# Altium schematic symbol library jlcpcb_2025_04_inductors_extended_0402.schlib: 1396 symbols (part 6 of 8) (continued)
## SDCL1005C1N2STDFM01
designator L?  Inductance: 1.2nH
Inductor, 1.2nH, SMD 0402; Manufacturer: Sunlord; Manufacturer Part Number: SDCL1005C1N2STDFM01; Package Size: 0402; JLCPCB Basic Part: No; JLCPCB Part Number: C279955; Supplier 1: LCSC; Category: Inductors; Supplier Part Number 1: C279955; RoHS: Yes; ComponentLink1Description: Datasheet; ComponentLink1URL: https://wmsc.lcsc.com/wmsc/upload/file/pdf/v2/lcsc/2110081430_Sunlord-SDCL1005C1N2STDFM01_C279955.pdf; ComponentLink2Description: JLCPCB Part URL; ComponentLink2URL: https://jlcpcb.com/partdetail/C279955; ComponentLink3Description: LCSC Part URL; ComponentLink3URL: https://lcsc.com/product-detail/Inductors-SMD_Sunlord-Sunlord-SDCL1005C1N2STDFM01_C279955.html
footprint IND-0402 (0402 (1005M) Inductor)
pins: 1, 2

## SDCL1005C1N3STDF
designator L?  Inductance: 1.3nH
Inductor, 1.3nH, 100mΩ, 400mA, SMD 0402; Manufacturer: Sunlord; Manufacturer Part Number: SDCL1005C1N3STDF; Self-Resonant Frequency: 10GHz; Q Factor: 8@100MHz; Package Size: 0402; JLCPCB Basic Part: No; JLCPCB Part Number: C279756; Supplier 1: LCSC; Category: Inductors; Supplier Part Number 1: C279756; Rated Current: 400mA; DC Resistance: 100mΩ; RoHS: Yes; ComponentLink1Description: Datasheet; ComponentLink1URL: https://wmsc.lcsc.com/wmsc/upload/file/pdf/v2/lcsc/2310301641_Sunlord-SDCL1005C1N3STDF_C279756.pdf; ComponentLink2Description: JLCPCB Part URL; ComponentLink2URL: https://jlcpcb.com/partdetail/C279756; ComponentLink3Description: LCSC Part URL; ComponentLink3URL: https://lcsc.com/product-detail/Inductors-SMD_Sunlord-Sunlord-SDCL1005C1N3STDF_C279756.html
footprint IND-0402 (0402 (1005M) Inductor)
pins: 1, 2

## SDCL1005C1N3STDFM01
designator L?  Inductance: 1.3nH
Inductor, 1.3nH, 100mΩ, 400mA, SMD 0402; Manufacturer: Sunlord; Manufacturer Part Number: SDCL1005C1N3STDFM01; Package Size: 0402; JLCPCB Basic Part: No; JLCPCB Part Number: C370195; Supplier 1: LCSC; Category: Inductors; Supplier Part Number 1: C370195; Rated Current: 400mA; DC Resistance: 100mΩ; RoHS: Yes; ComponentLink1Description: Datasheet; ComponentLink1URL: https://wmsc.lcsc.com/wmsc/upload/file/pdf/v2/lcsc/2110081530_Sunlord-SDCL1005C1N3STDFM01_C370195.pdf; ComponentLink2Description: JLCPCB Part URL; ComponentLink2URL: https://jlcpcb.com/partdetail/C370195; ComponentLink3Description: LCSC Part URL; ComponentLink3URL: https://lcsc.com/product-detail/Inductors-SMD_Sunlord-Sunlord-SDCL1005C1N3STDFM01_C370195.html
footprint IND-0402 (0402 (1005M) Inductor)
pins: 1, 2

## SDCL1005C1N5BTDF
designator L?  Inductance: 1.5nH
Inductor, 1.5nH, 100mΩ, 300mA, SMD 0402; Manufacturer: Sunlord; Manufacturer Part Number: SDCL1005C1N5BTDF; Package Size: 0402; JLCPCB Basic Part: No; JLCPCB Part Number: C370196; Supplier 1: LCSC; Category: Inductors; Supplier Part Number 1: C370196; Rated Current: 300mA; DC Resistance: 100mΩ; RoHS: Yes; ComponentLink1Description: Datasheet; ComponentLink1URL: https://wmsc.lcsc.com/wmsc/upload/file/pdf/v2/lcsc/2310301641_Sunlord-SDCL1005C1N5BTDF_C370196.pdf; ComponentLink2Description: JLCPCB Part URL; ComponentLink2URL: https://jlcpcb.com/partdetail/C370196; ComponentLink3Description: LCSC Part URL; ComponentLink3URL: https://lcsc.com/product-detail/Inductors-SMD_Sunlord-Sunlord-SDCL1005C1N5BTDF_C370196.html
footprint IND-0402 (0402 (1005M) Inductor)
pins: 1, 2

## SDCL1005C1N5BTDFM01
designator L?  Inductance: 1.5nH
Inductor, 1.5nH, SMD 0402; Manufacturer: Sunlord; Manufacturer Part Number: SDCL1005C1N5BTDFM01; Package Size: 0402; JLCPCB Basic Part: No; JLCPCB Part Number: C370197; Supplier 1: LCSC; Category: Inductors; Supplier Part Number 1: C370197; RoHS: Yes; ComponentLink1Description: Datasheet; ComponentLink1URL: https://wmsc.lcsc.com/wmsc/upload/file/pdf/v2/lcsc/2110081530_Sunlord-SDCL1005C1N5BTDFM01_C370197.pdf; ComponentLink2Description: JLCPCB Part URL; ComponentLink2URL: https://jlcpcb.com/partdetail/C370197; ComponentLink3Description: LCSC Part URL; ComponentLink3URL: https://lcsc.com/product-detail/Inductors-SMD_Sunlord-Sunlord-SDCL1005C1N5BTDFM01_C370197.html
footprint IND-0402 (0402 (1005M) Inductor)
pins: 1, 2

## SDCL1005C1N5STDF
designator L?  Inductance: 1.5nH
Inductor, 1.5nH, 100mΩ, 300mA, SMD 0402; Manufacturer: Sunlord; Manufacturer Part Number: SDCL1005C1N5STDF; Self-Resonant Frequency: 100MHz; Q Factor: 8@100MHz; Package Size: 0402; JLCPCB Basic Part: No; JLCPCB Part Number: C27146; Supplier 1: LCSC; Category: Inductors; Supplier Part Number 1: C27146; Rated Current: 300mA; DC Resistance: 100mΩ; RoHS: Yes; ComponentLink1Description: Datasheet; ComponentLink1URL: https://wmsc.lcsc.com/wmsc/upload/file/pdf/v2/lcsc/2310301641_Sunlord-SDCL1005C1N5STDF_C27146.pdf; ComponentLink2Description: JLCPCB Part URL; ComponentLink2URL: https://jlcpcb.com/partdetail/C27146; ComponentLink3Description: LCSC Part URL; ComponentLink3URL: https://lcsc.com/product-detail/Inductors-SMD_Sunlord-Sunlord-SDCL1005C1N5STDF_C27146.html
footprint IND-0402 (0402 (1005M) Inductor)
pins: 1, 2

## SDCL1005C1N5STDFM01
designator L?  Inductance: 1.5nH
Inductor, 1.5nH, 100mΩ, 300mA, SMD 0402; Manufacturer: Sunlord; Manufacturer Part Number: SDCL1005C1N5STDFM01; Package Size: 0402; JLCPCB Basic Part: No; JLCPCB Part Number: C370198; Supplier 1: LCSC; Category: Inductors; Supplier Part Number 1: C370198; Rated Current: 300mA; DC Resistance: 100mΩ; RoHS: Yes; ComponentLink1Description: Datasheet; ComponentLink1URL: https://wmsc.lcsc.com/wmsc/upload/file/pdf/v2/lcsc/2110081530_Sunlord-SDCL1005C1N5STDFM01_C370198.pdf; ComponentLink2Description: JLCPCB Part URL; ComponentLink2URL: https://jlcpcb.com/partdetail/C370198; ComponentLink3Description: LCSC Part URL; ComponentLink3URL: https://lcsc.com/product-detail/Inductors-SMD_Sunlord-Sunlord-SDCL1005C1N5STDFM01_C370198.html
footprint IND-0402 (0402 (1005M) Inductor)
pins: 1, 2

## SDCL1005C1N5STDFM02
designator L?  Inductance: 1.5nH
Inductor, 1.5nH, SMD 0402; Manufacturer: Sunlord; Manufacturer Part Number: SDCL1005C1N5STDFM02; Package Size: 0402; JLCPCB Basic Part: No; JLCPCB Part Number: C370199; Supplier 1: LCSC; Category: Inductors; Supplier Part Number 1: C370199; RoHS: Yes; ComponentLink1Description: Datasheet; ComponentLink1URL: https://wmsc.lcsc.com/wmsc/upload/file/pdf/v2/lcsc/2110081530_Sunlord-SDCL1005C1N5STDFM02_C370199.pdf; ComponentLink2Description: JLCPCB Part URL; ComponentLink2URL: https://jlcpcb.com/partdetail/C370199; ComponentLink3Description: LCSC Part URL; ComponentLink3URL: https://lcsc.com/product-detail/Inductors-SMD_Sunlord-Sunlord-SDCL1005C1N5STDFM02_C370199.html
footprint IND-0402 (0402 (1005M) Inductor)
pins: 1, 2

## SDCL1005C1N6STDF
designator L?  Inductance: 1.6nH
Inductor, 1.6nH, 100mΩ, 300mA, SMD 0402; Manufacturer: Sunlord; Manufacturer Part Number: SDCL1005C1N6STDF; Self-Resonant Frequency: 100MHz; Q Factor: 8@100MHz; Package Size: 0402; JLCPCB Basic Part: No; JLCPCB Part Number: C96729; Supplier 1: LCSC; Category: Inductors; Supplier Part Number 1: C96729; Rated Current: 300mA; DC Resistance: 100mΩ; RoHS: Yes; ComponentLink1Description: Datasheet; ComponentLink1URL: https://wmsc.lcsc.com/wmsc/upload/file/pdf/v2/lcsc/2310301641_Sunlord-SDCL1005C1N6STDF_C96729.pdf; ComponentLink2Description: JLCPCB Part URL; ComponentLink2URL: https://jlcpcb.com/partdetail/C96729; ComponentLink3Description: LCSC Part URL; ComponentLink3URL: https://lcsc.com/product-detail/Inductors-SMD_Sunlord-Sunlord-SDCL1005C1N6STDF_C96729.html
footprint IND-0402 (0402 (1005M) Inductor)
pins: 1, 2

## SDCL1005C1N6STDFM01
designator L?  Inductance: 1.6nH
Inductor, 1.6nH, 100mΩ, 300mA, SMD 0402; Manufacturer: Sunlord; Manufacturer Part Number: SDCL1005C1N6STDFM01; Package Size: 0402; JLCPCB Basic Part: No; JLCPCB Part Number: C279912; Supplier 1: LCSC; Category: Inductors; Supplier Part Number 1: C279912; Rated Current: 300mA; DC Resistance: 100mΩ; RoHS: Yes; ComponentLink1Description: Datasheet; ComponentLink1URL: https://wmsc.lcsc.com/wmsc/upload/file/pdf/v2/lcsc/2110081430_Sunlord-SDCL1005C1N6STDFM01_C279912.pdf; ComponentLink2Description: JLCPCB Part URL; ComponentLink2URL: https://jlcpcb.com/partdetail/C279912; ComponentLink3Description: LCSC Part URL; ComponentLink3URL: https://lcsc.com/product-detail/Inductors-SMD_Sunlord-Sunlord-SDCL1005C1N6STDFM01_C279912.html
footprint IND-0402 (0402 (1005M) Inductor)
pins: 1, 2

## SDCL1005C1N8BTDFM01
designator L?  Inductance: 1.8nH
Inductor, 1.8nH, 100mΩ, 300mA, SMD 0402; Manufacturer: Sunlord; Manufacturer Part Number: SDCL1005C1N8BTDFM01; Package Size: 0402; JLCPCB Basic Part: No; JLCPCB Part Number: C279905; Supplier 1: LCSC; Category: Inductors; Supplier Part Number 1: C279905; Rated Current: 300mA; DC Resistance: 100mΩ; RoHS: Yes; ComponentLink1Description: Datasheet; ComponentLink1URL: https://wmsc.lcsc.com/wmsc/upload/file/pdf/v2/lcsc/2110081430_Sunlord-SDCL1005C1N8BTDFM01_C279905.pdf; ComponentLink2Description: JLCPCB Part URL; ComponentLink2URL: https://jlcpcb.com/partdetail/C279905; ComponentLink3Description: LCSC Part URL; ComponentLink3URL: https://lcsc.com/product-detail/Inductors-SMD_Sunlord-Sunlord-SDCL1005C1N8BTDFM01_C279905.html
footprint IND-0402 (0402 (1005M) Inductor)
pins: 1, 2

## SDCL1005C1N8CTDFM01
designator L?  Inductance: 1.8nH
Inductor, 1.8nH, 100mΩ, 300mA, SMD 0402; Manufacturer: Sunlord; Manufacturer Part Number: SDCL1005C1N8CTDFM01; Package Size: 0402; JLCPCB Basic Part: No; JLCPCB Part Number: C279731; Supplier 1: LCSC; Category: Inductors; Supplier Part Number 1: C279731; Rated Current: 300mA; DC Resistance: 100mΩ; RoHS: Yes; ComponentLink1Description: Datasheet; ComponentLink1URL: https://wmsc.lcsc.com/wmsc/upload/file/pdf/v2/lcsc/2110081330_Sunlord-SDCL1005C1N8CTDFM01_C279731.pdf; ComponentLink2Description: JLCPCB Part URL; ComponentLink2URL: https://jlcpcb.com/partdetail/C279731; ComponentLink3Description: LCSC Part URL; ComponentLink3URL: https://lcsc.com/product-detail/Inductors-SMD_Sunlord-Sunlord-SDCL1005C1N8CTDFM01_C279731.html
footprint IND-0402 (0402 (1005M) Inductor)
pins: 1, 2

## SDCL1005C1N8STDF
designator L?  Inductance: 1.8nH
Inductor, 1.8nH, 100mΩ, 300mA, SMD 0402; Manufacturer: Sunlord; Manufacturer Part Number: SDCL1005C1N8STDF; Self-Resonant Frequency: 6GHz; Q Factor: 8@100MHz; Package Size: 0402; JLCPCB Basic Part: No; JLCPCB Part Number: C18304; Supplier 1: LCSC; Category: Inductors; Supplier Part Number 1: C18304; Rated Current: 300mA; DC Resistance: 100mΩ; RoHS: Yes; ComponentLink1Description: Datasheet; ComponentLink1URL: https://wmsc.lcsc.com/wmsc/upload/file/pdf/v2/lcsc/2310301641_Sunlord-SDCL1005C1N8STDF_C18304.pdf; ComponentLink2Description: JLCPCB Part URL; ComponentLink2URL: https://jlcpcb.com/partdetail/C18304; ComponentLink3Description: LCSC Part URL; ComponentLink3URL: https://lcsc.com/product-detail/Inductors-SMD_Sunlord-Sunlord-SDCL1005C1N8STDF_C18304.html
footprint IND-0402 (0402 (1005M) Inductor)
pins: 1, 2

## SDCL1005C1N8STDFM01
designator L?  Inductance: 1.8nH
Inductor, 1.8nH, 100mΩ, 300mA, SMD 0402; Manufacturer: Sunlord; Manufacturer Part Number: SDCL1005C1N8STDFM01; Package Size: 0402; JLCPCB Basic Part: No; JLCPCB Part Number: C370202; Supplier 1: LCSC; Category: Inductors; Supplier Part Number 1: C370202; Rated Current: 300mA; DC Resistance: 100mΩ; RoHS: Yes; ComponentLink1Description: Datasheet; ComponentLink1URL: https://wmsc.lcsc.com/wmsc/upload/file/pdf/v2/lcsc/2110081530_Sunlord-SDCL1005C1N8STDFM01_C370202.pdf; ComponentLink2Description: JLCPCB Part URL; ComponentLink2URL: https://jlcpcb.com/partdetail/C370202; ComponentLink3Description: LCSC Part URL; ComponentLink3URL: https://lcsc.com/product-detail/Inductors-SMD_Sunlord-Sunlord-SDCL1005C1N8STDFM01_C370202.html
footprint IND-0402 (0402 (1005M) Inductor)
pins: 1, 2

## SDCL1005C1N8STDFM02
designator L?  Inductance: 1.8nH
Inductor, 1.8nH, SMD 0402; Manufacturer: Sunlord; Manufacturer Part Number: SDCL1005C1N8STDFM02; Package Size: 0402; JLCPCB Basic Part: No; JLCPCB Part Number: C370203; Supplier 1: LCSC; Category: Inductors; Supplier Part Number 1: C370203; RoHS: Yes; ComponentLink1Description: Datasheet; ComponentLink1URL: https://wmsc.lcsc.com/wmsc/upload/file/pdf/v2/lcsc/2110081530_Sunlord-SDCL1005C1N8STDFM02_C370203.pdf; ComponentLink2Description: JLCPCB Part URL; ComponentLink2URL: https://jlcpcb.com/partdetail/C370203; ComponentLink3Description: LCSC Part URL; ComponentLink3URL: https://lcsc.com/product-detail/Inductors-SMD_Sunlord-Sunlord-SDCL1005C1N8STDFM02_C370203.html
footprint IND-0402 (0402 (1005M) Inductor)
pins: 1, 2

## SDCL1005C2N0BTDF
designator L?  Inductance: 2nH
Inductor, 2nH, 200mΩ, 300mA, SMD 0402; Manufacturer: Sunlord; Manufacturer Part Number: SDCL1005C2N0BTDF; Package Size: 0402; JLCPCB Basic Part: No; JLCPCB Part Number: C279790; Supplier 1: LCSC; Category: Inductors; Supplier Part Number 1: C279790; Rated Current: 300mA; DC Resistance: 200mΩ; RoHS: Yes; ComponentLink1Description: Datasheet; ComponentLink1URL: https://wmsc.lcsc.com/wmsc/upload/file/pdf/v2/lcsc/2310301641_Sunlord-SDCL1005C2N0BTDF_C279790.pdf; ComponentLink2Description: JLCPCB Part URL; ComponentLink2URL: https://jlcpcb.com/partdetail/C279790; ComponentLink3Description: LCSC Part URL; ComponentLink3URL: https://lcsc.com/product-detail/Inductors-SMD_Sunlord-Sunlord-SDCL1005C2N0BTDF_C279790.html
footprint IND-0402 (0402 (1005M) Inductor)
pins: 1, 2

## SDCL1005C2N0CTDF
designator L?  Inductance: 2nH
Inductor, 2nH, 200mΩ, 300mA, SMD 0402; Manufacturer: Sunlord; Manufacturer Part Number: SDCL1005C2N0CTDF; Q Factor: 8@100MHz; Package Size: 0402; JLCPCB Basic Part: No; JLCPCB Part Number: C370205; Supplier 1: LCSC; Category: Inductors; Supplier Part Number 1: C370205; Rated Current: 300mA; DC Resistance: 200mΩ; RoHS: Yes; ComponentLink1Description: Datasheet; ComponentLink1URL: https://wmsc.lcsc.com/wmsc/upload/file/pdf/v2/lcsc/2310301641_Sunlord-SDCL1005C2N0CTDF_C370205.pdf; ComponentLink2Description: JLCPCB Part URL; ComponentLink2URL: https://jlcpcb.com/partdetail/C370205; ComponentLink3Description: LCSC Part URL; ComponentLink3URL: https://lcsc.com/product-detail/Inductors-SMD_Sunlord-Sunlord-SDCL1005C2N0CTDF_C370205.html
footprint IND-0402 (0402 (1005M) Inductor)
pins: 1, 2

## SDCL1005C2N0STDF
designator L?  Inductance: 2nH
Inductor, 2nH, 200mΩ, 300mA, SMD 0402; Manufacturer: Sunlord; Manufacturer Part Number: SDCL1005C2N0STDF; Self-Resonant Frequency: 100MHz; Q Factor: 8@100MHz; Package Size: 0402; JLCPCB Basic Part: No; JLCPCB Part Number: C43365; Supplier 1: LCSC; Category: Inductors; Supplier Part Number 1: C43365; Rated Current: 300mA; DC Resistance: 200mΩ; RoHS: Yes; ComponentLink1Description: Datasheet; ComponentLink1URL: https://wmsc.lcsc.com/wmsc/upload/file/pdf/v2/lcsc/2310301641_Sunlord-SDCL1005C2N0STDF_C43365.pdf; ComponentLink2Description: JLCPCB Part URL; ComponentLink2URL: https://jlcpcb.com/partdetail/C43365; ComponentLink3Description: LCSC Part URL; ComponentLink3URL: https://lcsc.com/product-detail/Inductors-SMD_Sunlord-Sunlord-SDCL1005C2N0STDF_C43365.html
footprint IND-0402 (0402 (1005M) Inductor)
pins: 1, 2

## SDCL1005C2N0STDFM01
designator L?  Inductance: 2nH
Inductor, 2nH, 200mΩ, 300mA, SMD 0402; Manufacturer: Sunlord; Manufacturer Part Number: SDCL1005C2N0STDFM01; Package Size: 0402; JLCPCB Basic Part: No; JLCPCB Part Number: C370206; Supplier 1: LCSC; Category: Inductors; Supplier Part Number 1: C370206; Rated Current: 300mA; DC Resistance: 200mΩ; RoHS: Yes; ComponentLink1Description: Datasheet; ComponentLink1URL: https://wmsc.lcsc.com/wmsc/upload/file/pdf/v2/lcsc/2110081530_Sunlord-SDCL1005C2N0STDFM01_C370206.pdf; ComponentLink2Description: JLCPCB Part URL; ComponentLink2URL: https://jlcpcb.com/partdetail/C370206; ComponentLink3Description: LCSC Part URL; ComponentLink3URL: https://lcsc.com/product-detail/Inductors-SMD_Sunlord-Sunlord-SDCL1005C2N0STDFM01_C370206.html
footprint IND-0402 (0402 (1005M) Inductor)
pins: 1, 2

## SDCL1005C2N2BTDF
designator L?  Inductance: 2.2nH
Inductor, 2.2nH, 200mΩ, 300mA, SMD 0402; Manufacturer: Sunlord; Manufacturer Part Number: SDCL1005C2N2BTDF; Self-Resonant Frequency: 6GHz; Q Factor: 8@100MHz; Package Size: 0402; JLCPCB Basic Part: No; JLCPCB Part Number: C525658; Supplier 1: LCSC; Category: Inductors; Supplier Part Number 1: C525658; Rated Current: 300mA; DC Resistance: 200mΩ; RoHS: Yes; ComponentLink1Description: Datasheet; ComponentLink1URL: https://wmsc.lcsc.com/wmsc/upload/file/pdf/v2/lcsc/2310301641_Sunlord-SDCL1005C2N2BTDF_C525658.pdf; ComponentLink2Description: JLCPCB Part URL; ComponentLink2URL: https://jlcpcb.com/partdetail/C525658; ComponentLink3Description: LCSC Part URL; ComponentLink3URL: https://lcsc.com/product-detail/Inductors-SMD_Sunlord-Sunlord-SDCL1005C2N2BTDF_C525658.html
footprint IND-0402 (0402 (1005M) Inductor)
pins: 1, 2

## SDCL1005C2N2BTDFM01
designator L?  Inductance: 2.2nH
Inductor, 2.2nH, SMD 0402; Manufacturer: Sunlord; Manufacturer Part Number: SDCL1005C2N2BTDFM01; Package Size: 0402; JLCPCB Basic Part: No; JLCPCB Part Number: C370207; Supplier 1: LCSC; Category: Inductors; Supplier Part Number 1: C370207; RoHS: Yes; ComponentLink1Description: Datasheet; ComponentLink1URL: https://wmsc.lcsc.com/wmsc/upload/file/pdf/v2/lcsc/2110081530_Sunlord-SDCL1005C2N2BTDFM01_C370207.pdf; ComponentLink2Description: JLCPCB Part URL; ComponentLink2URL: https://jlcpcb.com/partdetail/C370207; ComponentLink3Description: LCSC Part URL; ComponentLink3URL: https://lcsc.com/product-detail/Inductors-SMD_Sunlord-Sunlord-SDCL1005C2N2BTDFM01_C370207.html
footprint IND-0402 (0402 (1005M) Inductor)
pins: 1, 2

## SDCL1005C2N2CTDF
designator L?  Inductance: 2.2nH
Inductor, 2.2nH, 200mΩ, 300mA, SMD 0402; Manufacturer: Sunlord; Manufacturer Part Number: SDCL1005C2N2CTDF; Self-Resonant Frequency: 6GHz; Q Factor: 8@100MHz; Package Size: 0402; JLCPCB Basic Part: No; JLCPCB Part Number: C918998; Supplier 1: LCSC; Category: Inductors; Supplier Part Number 1: C918998; Rated Current: 300mA; DC Resistance: 200mΩ; RoHS: Yes; ComponentLink1Description: Datasheet; ComponentLink1URL: https://wmsc.lcsc.com/wmsc/upload/file/pdf/v2/lcsc/2310301641_Sunlord-SDCL1005C2N2CTDF_C918998.pdf; ComponentLink2Description: JLCPCB Part URL; ComponentLink2URL: https://jlcpcb.com/partdetail/C918998; ComponentLink3Description: LCSC Part URL; ComponentLink3URL: https://lcsc.com/product-detail/Inductors-SMD_Sunlord-Sunlord-SDCL1005C2N2CTDF_C918998.html
footprint IND-0402 (0402 (1005M) Inductor)
pins: 1, 2

## SDCL1005C2N2STDF
designator L?  Inductance: 2.2nH
Inductor, 2.2nH, 200mΩ, 300mA, SMD 0402; Manufacturer: Sunlord; Manufacturer Part Number: SDCL1005C2N2STDF; Self-Resonant Frequency: 100MHz; Q Factor: 8@100MHz; Package Size: 0402; JLCPCB Basic Part: No; JLCPCB Part Number: C27122; Supplier 1: LCSC; Category: Inductors; Supplier Part Number 1: C27122; Rated Current: 300mA; DC Resistance: 200mΩ; RoHS: Yes; ComponentLink1Description: Datasheet; ComponentLink1URL: https://wmsc.lcsc.com/wmsc/upload/file/pdf/v2/lcsc/2310301641_Sunlord-SDCL1005C2N2STDF_C27122.pdf; ComponentLink2Description: JLCPCB Part URL; ComponentLink2URL: https://jlcpcb.com/partdetail/C27122; ComponentLink3Description: LCSC Part URL; ComponentLink3URL: https://lcsc.com/product-detail/Inductors-SMD_Sunlord-Sunlord-SDCL1005C2N2STDF_C27122.html
footprint IND-0402 (0402 (1005M) Inductor)
pins: 1, 2

## SDCL1005C2N2STDFM01
designator L?  Inductance: 2.2nH
Inductor, 2.2nH, 200mΩ, 300mA, SMD 0402; Manufacturer: Sunlord; Manufacturer Part Number: SDCL1005C2N2STDFM01; Package Size: 0402; JLCPCB Basic Part: No; JLCPCB Part Number: C279853; Supplier 1: LCSC; Category: Inductors; Supplier Part Number 1: C279853; Rated Current: 300mA; DC Resistance: 200mΩ; RoHS: Yes; ComponentLink1Description: Datasheet; ComponentLink1URL: https://wmsc.lcsc.com/wmsc/upload/file/pdf/v2/lcsc/2110081330_Sunlord-SDCL1005C2N2STDFM01_C279853.pdf; ComponentLink2Description: JLCPCB Part URL; ComponentLink2URL: https://jlcpcb.com/partdetail/C279853; ComponentLink3Description: LCSC Part URL; ComponentLink3URL: https://lcsc.com/product-detail/Inductors-SMD_Sunlord-Sunlord-SDCL1005C2N2STDFM01_C279853.html
footprint IND-0402 (0402 (1005M) Inductor)
pins: 1, 2

## SDCL1005C2N2STDFM02
designator L?  Inductance: 2.2nH
Inductor, 2.2nH, SMD 0402; Manufacturer: Sunlord; Manufacturer Part Number: SDCL1005C2N2STDFM02; Package Size: 0402; JLCPCB Basic Part: No; JLCPCB Part Number: C370208; Supplier 1: LCSC; Category: Inductors; Supplier Part Number 1: C370208; RoHS: Yes; ComponentLink1Description: Datasheet; ComponentLink1URL: https://wmsc.lcsc.com/wmsc/upload/file/pdf/v2/lcsc/2110081530_Sunlord-SDCL1005C2N2STDFM02_C370208.pdf; ComponentLink2Description: JLCPCB Part URL; ComponentLink2URL: https://jlcpcb.com/partdetail/C370208; ComponentLink3Description: LCSC Part URL; ComponentLink3URL: https://lcsc.com/product-detail/Inductors-SMD_Sunlord-Sunlord-SDCL1005C2N2STDFM02_C370208.html
footprint IND-0402 (0402 (1005M) Inductor)
pins: 1, 2

## SDCL1005C2N4BTDF
designator L?  Inductance: 2.4nH
Inductor, 2.4nH, 200mΩ, 300mA, SMD 0402; Manufacturer: Sunlord; Manufacturer Part Number: SDCL1005C2N4BTDF; Package Size: 0402; JLCPCB Basic Part: No; JLCPCB Part Number: C370209; Supplier 1: LCSC; Category: Inductors; Supplier Part Number 1: C370209; Rated Current: 300mA; DC Resistance: 200mΩ; RoHS: Yes; ComponentLink1Description: Datasheet; ComponentLink1URL: https://wmsc.lcsc.com/wmsc/upload/file/pdf/v2/lcsc/2310301641_Sunlord-SDCL1005C2N4BTDF_C370209.pdf; ComponentLink2Description: JLCPCB Part URL; ComponentLink2URL: https://jlcpcb.com/partdetail/C370209; ComponentLink3Description: LCSC Part URL; ComponentLink3URL: https://lcsc.com/product-detail/Inductors-SMD_Sunlord-Sunlord-SDCL1005C2N4BTDF_C370209.html
footprint IND-0402 (0402 (1005M) Inductor)
pins: 1, 2

## SDCL1005C2N4BTDFM01
designator L?  Inductance: 2.4nH
Inductor, 2.4nH, SMD 0402; Manufacturer: Sunlord; Manufacturer Part Number: SDCL1005C2N4BTDFM01; Package Size: 0402; JLCPCB Basic Part: No; JLCPCB Part Number: C370210; Supplier 1: LCSC; Category: Inductors; Supplier Part Number 1: C370210; RoHS: Yes; ComponentLink1Description: Datasheet; ComponentLink1URL: https://wmsc.lcsc.com/wmsc/upload/file/pdf/v2/lcsc/2110081530_Sunlord-SDCL1005C2N4BTDFM01_C370210.pdf; ComponentLink2Description: JLCPCB Part URL; ComponentLink2URL: https://jlcpcb.com/partdetail/C370210; ComponentLink3Description: LCSC Part URL; ComponentLink3URL: https://lcsc.com/product-detail/Inductors-SMD_Sunlord-Sunlord-SDCL1005C2N4BTDFM01_C370210.html
footprint IND-0402 (0402 (1005M) Inductor)
pins: 1, 2

## SDCL1005C2N4STDF
designator L?  Inductance: 2.4nH
Inductor, 2.4nH, 200mΩ, 300mA, SMD 0402; Manufacturer: Sunlord; Manufacturer Part Number: SDCL1005C2N4STDF; Self-Resonant Frequency: 100MHz; Q Factor: 8@100MHz; Package Size: 0402; JLCPCB Basic Part: No; JLCPCB Part Number: C22727; Supplier 1: LCSC; Category: Inductors; Supplier Part Number 1: C22727; Rated Current: 300mA; DC Resistance: 200mΩ; RoHS: Yes; ComponentLink1Description: Datasheet; ComponentLink1URL: https://wmsc.lcsc.com/wmsc/upload/file/pdf/v2/lcsc/2310301641_Sunlord-SDCL1005C2N4STDF_C22727.pdf; ComponentLink2Description: JLCPCB Part URL; ComponentLink2URL: https://jlcpcb.com/partdetail/C22727; ComponentLink3Description: LCSC Part URL; ComponentLink3URL: https://lcsc.com/product-detail/Inductors-SMD_Sunlord-Sunlord-SDCL1005C2N4STDF_C22727.html
footprint IND-0402 (0402 (1005M) Inductor)
pins: 1, 2

## SDCL1005C2N4STDFM01
designator L?  Inductance: 2.4nH
Inductor, 2.4nH, 200mΩ, 300mA, SMD 0402; Manufacturer: Sunlord; Manufacturer Part Number: SDCL1005C2N4STDFM01; Package Size: 0402; JLCPCB Basic Part: No; JLCPCB Part Number: C370211; Supplier 1: LCSC; Category: Inductors; Supplier Part Number 1: C370211; Rated Current: 300mA; DC Resistance: 200mΩ; RoHS: Yes; ComponentLink1Description: Datasheet; ComponentLink1URL: https://wmsc.lcsc.com/wmsc/upload/file/pdf/v2/lcsc/2110081530_Sunlord-SDCL1005C2N4STDFM01_C370211.pdf; ComponentLink2Description: JLCPCB Part URL; ComponentLink2URL: https://jlcpcb.com/partdetail/C370211; ComponentLink3Description: LCSC Part URL; ComponentLink3URL: https://lcsc.com/product-detail/Inductors-SMD_Sunlord-Sunlord-SDCL1005C2N4STDFM01_C370211.html
footprint IND-0402 (0402 (1005M) Inductor)
pins: 1, 2

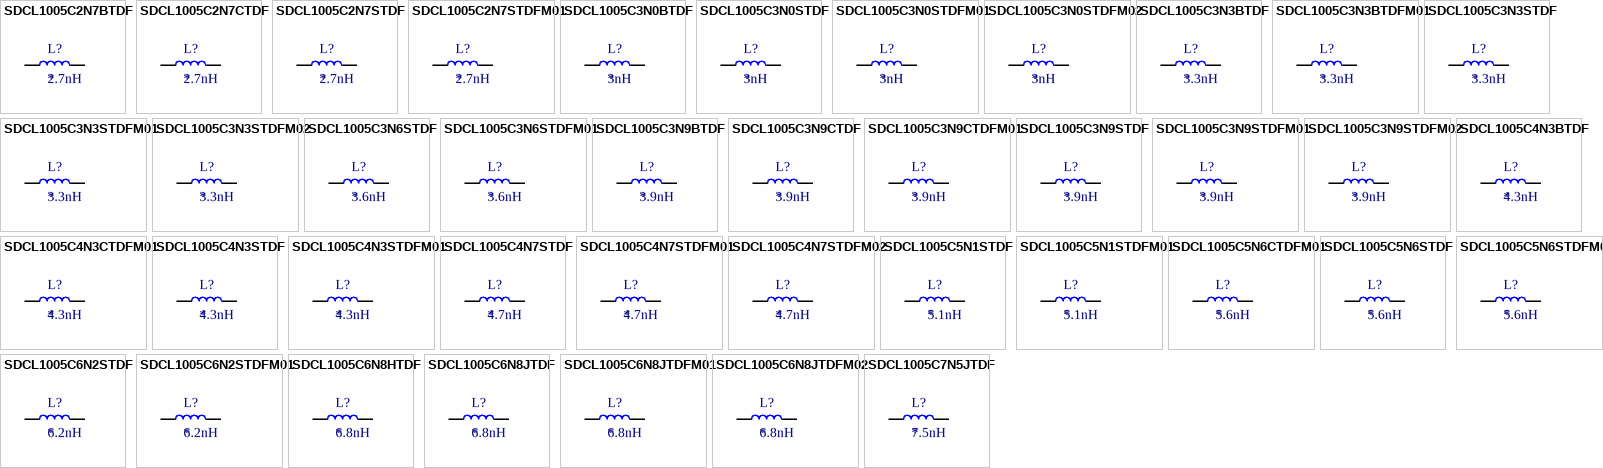
[diagram p27: symbols SDCL1005C2N7BTDF to SDCL1005C7N5JTDF]

## SDCL1005C2N7BTDF
designator L?  Inductance: 2.7nH
Inductor, 2.7nH, 200mΩ, 300mA, SMD 0402; Manufacturer: Sunlord; Manufacturer Part Number: SDCL1005C2N7BTDF; Package Size: 0402; JLCPCB Basic Part: No; JLCPCB Part Number: C279827; Supplier 1: LCSC; Category: Inductors; Supplier Part Number 1: C279827; Rated Current: 300mA; DC Resistance: 200mΩ; RoHS: Yes; ComponentLink1Description: Datasheet; ComponentLink1URL: https://wmsc.lcsc.com/wmsc/upload/file/pdf/v2/lcsc/2310301641_Sunlord-SDCL1005C2N7BTDF_C279827.pdf; ComponentLink2Description: JLCPCB Part URL; ComponentLink2URL: https://jlcpcb.com/partdetail/C279827; ComponentLink3Description: LCSC Part URL; ComponentLink3URL: https://lcsc.com/product-detail/Inductors-SMD_Sunlord-Sunlord-SDCL1005C2N7BTDF_C279827.html
footprint IND-0402 (0402 (1005M) Inductor)
pins: 1, 2

## SDCL1005C2N7CTDF
designator L?  Inductance: 2.7nH
Inductor, 2.7nH, 200mΩ, 300mA, SMD 0402; Manufacturer: Sunlord; Manufacturer Part Number: SDCL1005C2N7CTDF; Self-Resonant Frequency: 100MHz; Q Factor: 8@100MHz; Package Size: 0402; JLCPCB Basic Part: No; JLCPCB Part Number: C370213; Supplier 1: LCSC; Category: Inductors; Supplier Part Number 1: C370213; Rated Current: 300mA; DC Resistance: 200mΩ; RoHS: Yes; ComponentLink1Description: Datasheet; ComponentLink1URL: https://wmsc.lcsc.com/wmsc/upload/file/pdf/v2/lcsc/2310301641_Sunlord-SDCL1005C2N7CTDF_C370213.pdf; ComponentLink2Description: JLCPCB Part URL; ComponentLink2URL: https://jlcpcb.com/partdetail/C370213; ComponentLink3Description: LCSC Part URL; ComponentLink3URL: https://lcsc.com/product-detail/Inductors-SMD_Sunlord-Sunlord-SDCL1005C2N7CTDF_C370213.html
footprint IND-0402 (0402 (1005M) Inductor)
pins: 1, 2

## SDCL1005C2N7STDF
designator L?  Inductance: 2.7nH
Inductor, 2.7nH, 200mΩ, 300mA, SMD 0402; Manufacturer: Sunlord; Manufacturer Part Number: SDCL1005C2N7STDF; Self-Resonant Frequency: 100MHz; Q Factor: 8@100MHz; Package Size: 0402; JLCPCB Basic Part: No; JLCPCB Part Number: C27123; Supplier 1: LCSC; Category: Inductors; Supplier Part Number 1: C27123; Rated Current: 300mA; DC Resistance: 200mΩ; RoHS: Yes; ComponentLink1Description: Datasheet; ComponentLink1URL: https://wmsc.lcsc.com/wmsc/upload/file/pdf/v2/lcsc/2310301641_Sunlord-SDCL1005C2N7STDF_C27123.pdf; ComponentLink2Description: JLCPCB Part URL; ComponentLink2URL: https://jlcpcb.com/partdetail/C27123; ComponentLink3Description: LCSC Part URL; ComponentLink3URL: https://lcsc.com/product-detail/Inductors-SMD_Sunlord-Sunlord-SDCL1005C2N7STDF_C27123.html
footprint IND-0402 (0402 (1005M) Inductor)
pins: 1, 2

## SDCL1005C2N7STDFM01
designator L?  Inductance: 2.7nH
Inductor, 2.7nH, 200mΩ, 300mA, SMD 0402; Manufacturer: Sunlord; Manufacturer Part Number: SDCL1005C2N7STDFM01; Package Size: 0402; JLCPCB Basic Part: No; JLCPCB Part Number: C370214; Supplier 1: LCSC; Category: Inductors; Supplier Part Number 1: C370214; Rated Current: 300mA; DC Resistance: 200mΩ; RoHS: Yes; ComponentLink1Description: Datasheet; ComponentLink1URL: https://wmsc.lcsc.com/wmsc/upload/file/pdf/v2/lcsc/2110081530_Sunlord-SDCL1005C2N7STDFM01_C370214.pdf; ComponentLink2Description: JLCPCB Part URL; ComponentLink2URL: https://jlcpcb.com/partdetail/C370214; ComponentLink3Description: LCSC Part URL; ComponentLink3URL: https://lcsc.com/product-detail/Inductors-SMD_Sunlord-Sunlord-SDCL1005C2N7STDFM01_C370214.html
footprint IND-0402 (0402 (1005M) Inductor)
pins: 1, 2

## SDCL1005C3N0BTDF
designator L?  Inductance: 3nH
Inductor, 3nH, 200mΩ, 300mA, SMD 0402; Manufacturer: Sunlord; Manufacturer Part Number: SDCL1005C3N0BTDF; Package Size: 0402; JLCPCB Basic Part: No; JLCPCB Part Number: C370216; Supplier 1: LCSC; Category: Inductors; Supplier Part Number 1: C370216; Rated Current: 300mA; DC Resistance: 200mΩ; RoHS: Yes; ComponentLink1Description: Datasheet; ComponentLink1URL: https://wmsc.lcsc.com/wmsc/upload/file/pdf/v2/lcsc/2310301641_Sunlord-SDCL1005C3N0BTDF_C370216.pdf; ComponentLink2Description: JLCPCB Part URL; ComponentLink2URL: https://jlcpcb.com/partdetail/C370216; ComponentLink3Description: LCSC Part URL; ComponentLink3URL: https://lcsc.com/product-detail/Inductors-SMD_Sunlord-Sunlord-SDCL1005C3N0BTDF_C370216.html
footprint IND-0402 (0402 (1005M) Inductor)
pins: 1, 2

## SDCL1005C3N0STDF
designator L?  Inductance: 3nH
Inductor, 3nH, 200mΩ, 300mA, SMD 0402; Manufacturer: Sunlord; Manufacturer Part Number: SDCL1005C3N0STDF; Self-Resonant Frequency: 100MHz; Q Factor: 8@100MHz; Package Size: 0402; JLCPCB Basic Part: No; JLCPCB Part Number: C22718; Supplier 1: LCSC; Category: Inductors; Supplier Part Number 1: C22718; Rated Current: 300mA; DC Resistance: 200mΩ; RoHS: Yes; ComponentLink1Description: Datasheet; ComponentLink1URL: https://wmsc.lcsc.com/wmsc/upload/file/pdf/v2/lcsc/2310301641_Sunlord-SDCL1005C3N0STDF_C22718.pdf; ComponentLink2Description: JLCPCB Part URL; ComponentLink2URL: https://jlcpcb.com/partdetail/C22718; ComponentLink3Description: LCSC Part URL; ComponentLink3URL: https://lcsc.com/product-detail/Inductors-SMD_Sunlord-Sunlord-SDCL1005C3N0STDF_C22718.html
footprint IND-0402 (0402 (1005M) Inductor)
pins: 1, 2

## SDCL1005C3N0STDFM01
designator L?  Inductance: 3nH
Inductor, 3nH, 200mΩ, 300mA, SMD 0402; Manufacturer: Sunlord; Manufacturer Part Number: SDCL1005C3N0STDFM01; Package Size: 0402; JLCPCB Basic Part: No; JLCPCB Part Number: C370217; Supplier 1: LCSC; Category: Inductors; Supplier Part Number 1: C370217; Rated Current: 300mA; DC Resistance: 200mΩ; RoHS: Yes; ComponentLink1Description: Datasheet; ComponentLink1URL: https://wmsc.lcsc.com/wmsc/upload/file/pdf/v2/lcsc/2110081530_Sunlord-SDCL1005C3N0STDFM01_C370217.pdf; ComponentLink2Description: JLCPCB Part URL; ComponentLink2URL: https://jlcpcb.com/partdetail/C370217; ComponentLink3Description: LCSC Part URL; ComponentLink3URL: https://lcsc.com/product-detail/Inductors-SMD_Sunlord-Sunlord-SDCL1005C3N0STDFM01_C370217.html
footprint IND-0402 (0402 (1005M) Inductor)
pins: 1, 2

## SDCL1005C3N0STDFM02
designator L?  Inductance: 3nH
Inductor, 3nH, SMD 0402; Manufacturer: Sunlord; Manufacturer Part Number: SDCL1005C3N0STDFM02; Package Size: 0402; JLCPCB Basic Part: No; JLCPCB Part Number: C2680669; Supplier 1: LCSC; Category: Inductors; Supplier Part Number 1: C2680669; RoHS: Yes; ComponentLink1Description: Datasheet; ComponentLink1URL: https://wmsc.lcsc.com/wmsc/upload/file/pdf/v2/lcsc/2110081830_Sunlord-SDCL1005C3N0STDFM02_C2680669.pdf; ComponentLink2Description: JLCPCB Part URL; ComponentLink2URL: https://jlcpcb.com/partdetail/C2680669; ComponentLink3Description: LCSC Part URL; ComponentLink3URL: https://lcsc.com/product-detail/Inductors-SMD_Sunlord-Sunlord-SDCL1005C3N0STDFM02_C2680669.html
footprint IND-0402 (0402 (1005M) Inductor)
pins: 1, 2

## SDCL1005C3N3BTDF
designator L?  Inductance: 3.3nH
Inductor, 3.3nH, 200mΩ, 300mA, SMD 0402; Manufacturer: Sunlord; Manufacturer Part Number: SDCL1005C3N3BTDF; Package Size: 0402; JLCPCB Basic Part: No; JLCPCB Part Number: C370218; Supplier 1: LCSC; Category: Inductors; Supplier Part Number 1: C370218; Rated Current: 300mA; DC Resistance: 200mΩ; RoHS: Yes; ComponentLink1Description: Datasheet; ComponentLink1URL: https://wmsc.lcsc.com/wmsc/upload/file/pdf/v2/lcsc/2310301641_Sunlord-SDCL1005C3N3BTDF_C370218.pdf; ComponentLink2Description: JLCPCB Part URL; ComponentLink2URL: https://jlcpcb.com/partdetail/C370218; ComponentLink3Description: LCSC Part URL; ComponentLink3URL: https://lcsc.com/product-detail/Inductors-SMD_Sunlord-Sunlord-SDCL1005C3N3BTDF_C370218.html
footprint IND-0402 (0402 (1005M) Inductor)
pins: 1, 2

## SDCL1005C3N3BTDFM01
designator L?  Inductance: 3.3nH
Inductor, 3.3nH, SMD 0402; Manufacturer: Sunlord; Manufacturer Part Number: SDCL1005C3N3BTDFM01; Package Size: 0402; JLCPCB Basic Part: No; JLCPCB Part Number: C370219; Supplier 1: LCSC; Category: Inductors; Supplier Part Number 1: C370219; RoHS: Yes; ComponentLink1Description: Datasheet; ComponentLink1URL: https://wmsc.lcsc.com/wmsc/upload/file/pdf/v2/lcsc/2110081530_Sunlord-SDCL1005C3N3BTDFM01_C370219.pdf; ComponentLink2Description: JLCPCB Part URL; ComponentLink2URL: https://jlcpcb.com/partdetail/C370219; ComponentLink3Description: LCSC Part URL; ComponentLink3URL: https://lcsc.com/product-detail/Inductors-SMD_Sunlord-Sunlord-SDCL1005C3N3BTDFM01_C370219.html
footprint IND-0402 (0402 (1005M) Inductor)
pins: 1, 2

## SDCL1005C3N3STDF
designator L?  Inductance: 3.3nH
Inductor, 3.3nH, 200mΩ, 300mA, SMD 0402; Manufacturer: Sunlord; Manufacturer Part Number: SDCL1005C3N3STDF; Q Factor: 8@100MHz; Package Size: 0402; JLCPCB Basic Part: No; JLCPCB Part Number: C16526; Supplier 1: LCSC; Category: Inductors; Supplier Part Number 1: C16526; Rated Current: 300mA; DC Resistance: 200mΩ; RoHS: Yes; ComponentLink1Description: Datasheet; ComponentLink1URL: https://wmsc.lcsc.com/wmsc/upload/file/pdf/v2/lcsc/2310301641_Sunlord-SDCL1005C3N3STDF_C16526.pdf; ComponentLink2Description: JLCPCB Part URL; ComponentLink2URL: https://jlcpcb.com/partdetail/C16526; ComponentLink3Description: LCSC Part URL; ComponentLink3URL: https://lcsc.com/product-detail/Inductors-SMD_Sunlord-Sunlord-SDCL1005C3N3STDF_C16526.html
footprint IND-0402 (0402 (1005M) Inductor)
pins: 1, 2

## SDCL1005C3N3STDFM01
designator L?  Inductance: 3.3nH
Inductor, 3.3nH, 200mΩ, 300mA, SMD 0402; Manufacturer: Sunlord; Manufacturer Part Number: SDCL1005C3N3STDFM01; Package Size: 0402; JLCPCB Basic Part: No; JLCPCB Part Number: C279777; Supplier 1: LCSC; Category: Inductors; Supplier Part Number 1: C279777; Rated Current: 300mA; DC Resistance: 200mΩ; RoHS: Yes; ComponentLink1Description: Datasheet; ComponentLink1URL: https://wmsc.lcsc.com/wmsc/upload/file/pdf/v2/lcsc/2110081330_Sunlord-SDCL1005C3N3STDFM01_C279777.pdf; ComponentLink2Description: JLCPCB Part URL; ComponentLink2URL: https://jlcpcb.com/partdetail/C279777; ComponentLink3Description: LCSC Part URL; ComponentLink3URL: https://lcsc.com/product-detail/Inductors-SMD_Sunlord-Sunlord-SDCL1005C3N3STDFM01_C279777.html
footprint IND-0402 (0402 (1005M) Inductor)
pins: 1, 2

## SDCL1005C3N3STDFM02
designator L?  Inductance: 3.3nH
Inductor, 3.3nH, SMD 0402; Manufacturer: Sunlord; Manufacturer Part Number: SDCL1005C3N3STDFM02; Package Size: 0402; JLCPCB Basic Part: No; JLCPCB Part Number: C370220; Supplier 1: LCSC; Category: Inductors; Supplier Part Number 1: C370220; RoHS: Yes; ComponentLink1Description: Datasheet; ComponentLink1URL: https://wmsc.lcsc.com/wmsc/upload/file/pdf/v2/lcsc/2110081530_Sunlord-SDCL1005C3N3STDFM02_C370220.pdf; ComponentLink2Description: JLCPCB Part URL; ComponentLink2URL: https://jlcpcb.com/partdetail/C370220; ComponentLink3Description: LCSC Part URL; ComponentLink3URL: https://lcsc.com/product-detail/Inductors-SMD_Sunlord-Sunlord-SDCL1005C3N3STDFM02_C370220.html
footprint IND-0402 (0402 (1005M) Inductor)
pins: 1, 2

## SDCL1005C3N6STDF
designator L?  Inductance: 3.6nH
Inductor, 3.6nH, 200mΩ, 300mA, SMD 0402; Manufacturer: Sunlord; Manufacturer Part Number: SDCL1005C3N6STDF; Self-Resonant Frequency: 100MHz; Q Factor: 8@100MHz; Package Size: 0402; JLCPCB Basic Part: No; JLCPCB Part Number: C279530; Supplier 1: LCSC; Category: Inductors; Supplier Part Number 1: C279530; Rated Current: 300mA; DC Resistance: 200mΩ; RoHS: Yes; ComponentLink1Description: Datasheet; ComponentLink1URL: https://wmsc.lcsc.com/wmsc/upload/file/pdf/v2/lcsc/2310301641_Sunlord-SDCL1005C3N6STDF_C279530.pdf; ComponentLink2Description: JLCPCB Part URL; ComponentLink2URL: https://jlcpcb.com/partdetail/C279530; ComponentLink3Description: LCSC Part URL; ComponentLink3URL: https://lcsc.com/product-detail/Inductors-SMD_Sunlord-Sunlord-SDCL1005C3N6STDF_C279530.html
footprint IND-0402 (0402 (1005M) Inductor)
pins: 1, 2

## SDCL1005C3N6STDFM01
designator L?  Inductance: 3.6nH
Inductor, 3.6nH, 200mΩ, 300mA, SMD 0402; Manufacturer: Sunlord; Manufacturer Part Number: SDCL1005C3N6STDFM01; Package Size: 0402; JLCPCB Basic Part: No; JLCPCB Part Number: C370221; Supplier 1: LCSC; Category: Inductors; Supplier Part Number 1: C370221; Rated Current: 300mA; DC Resistance: 200mΩ; RoHS: Yes; ComponentLink1Description: Datasheet; ComponentLink1URL: https://wmsc.lcsc.com/wmsc/upload/file/pdf/v2/lcsc/2110081530_Sunlord-SDCL1005C3N6STDFM01_C370221.pdf; ComponentLink2Description: JLCPCB Part URL; ComponentLink2URL: https://jlcpcb.com/partdetail/C370221; ComponentLink3Description: LCSC Part URL; ComponentLink3URL: https://lcsc.com/product-detail/Inductors-SMD_Sunlord-Sunlord-SDCL1005C3N6STDFM01_C370221.html
footprint IND-0402 (0402 (1005M) Inductor)
pins: 1, 2

## SDCL1005C3N9BTDF
designator L?  Inductance: 3.9nH
Inductor, 3.9nH, 0.2Ω, 300mA, SMD 0402; Manufacturer: Sunlord; Manufacturer Part Number: SDCL1005C3N9BTDF; Self-Resonant Frequency: 4GHz; Q Factor: 8@100MHz; Package Size: 0402; JLCPCB Basic Part: No; JLCPCB Part Number: C2880103; Supplier 1: LCSC; Category: Inductors; Supplier Part Number 1: C2880103; Rated Current: 300mA; DC Resistance: 0.2Ω; RoHS: Yes; ComponentLink1Description: Datasheet; ComponentLink1URL: https://wmsc.lcsc.com/wmsc/upload/file/pdf/v2/lcsc/2310301641_Sunlord-SDCL1005C3N9BTDF_C2880103.pdf; ComponentLink2Description: JLCPCB Part URL; ComponentLink2URL: https://jlcpcb.com/partdetail/C2880103; ComponentLink3Description: LCSC Part URL; ComponentLink3URL: https://lcsc.com/product-detail/Inductors-SMD_Sunlord-Sunlord-SDCL1005C3N9BTDF_C2880103.html
footprint IND-0402 (0402 (1005M) Inductor)
pins: 1, 2

## SDCL1005C3N9CTDF
designator L?  Inductance: 3.9nH
Inductor, 3.9nH, 200mΩ, 300mA, SMD 0402; Manufacturer: Sunlord; Manufacturer Part Number: SDCL1005C3N9CTDF; Self-Resonant Frequency: 100MHz; Q Factor: 8@100MHz; Package Size: 0402; JLCPCB Basic Part: No; JLCPCB Part Number: C305126; Supplier 1: LCSC; Category: Inductors; Supplier Part Number 1: C305126; Rated Current: 300mA; DC Resistance: 200mΩ; RoHS: Yes; ComponentLink1Description: Datasheet; ComponentLink1URL: https://wmsc.lcsc.com/wmsc/upload/file/pdf/v2/lcsc/2310301641_Sunlord-SDCL1005C3N9CTDF_C305126.pdf; ComponentLink2Description: JLCPCB Part URL; ComponentLink2URL: https://jlcpcb.com/partdetail/C305126; ComponentLink3Description: LCSC Part URL; ComponentLink3URL: https://lcsc.com/product-detail/Inductors-SMD_Sunlord-Sunlord-SDCL1005C3N9CTDF_C305126.html
footprint IND-0402 (0402 (1005M) Inductor)
pins: 1, 2

## SDCL1005C3N9CTDFM01
designator L?  Inductance: 3.9nH
Inductor, 3.9nH, SMD 0402; Manufacturer: Sunlord; Manufacturer Part Number: SDCL1005C3N9CTDFM01; Package Size: 0402; JLCPCB Basic Part: No; JLCPCB Part Number: C370222; Supplier 1: LCSC; Category: Inductors; Supplier Part Number 1: C370222; RoHS: Yes; ComponentLink1Description: Datasheet; ComponentLink1URL: https://wmsc.lcsc.com/wmsc/upload/file/pdf/v2/lcsc/2110081530_Sunlord-SDCL1005C3N9CTDFM01_C370222.pdf; ComponentLink2Description: JLCPCB Part URL; ComponentLink2URL: https://jlcpcb.com/partdetail/C370222; ComponentLink3Description: LCSC Part URL; ComponentLink3URL: https://lcsc.com/product-detail/Inductors-SMD_Sunlord-Sunlord-SDCL1005C3N9CTDFM01_C370222.html
footprint IND-0402 (0402 (1005M) Inductor)
pins: 1, 2

## SDCL1005C3N9STDF
designator L?  Inductance: 3.9nH
Inductor, 3.9nH, 200mΩ, 300mA, SMD 0402; Manufacturer: Sunlord; Manufacturer Part Number: SDCL1005C3N9STDF; Self-Resonant Frequency: 4GHz; Q Factor: 8@100MHz; Package Size: 0402; JLCPCB Basic Part: No; JLCPCB Part Number: C14033; Supplier 1: LCSC; Category: Inductors; Supplier Part Number 1: C14033; Rated Current: 300mA; DC Resistance: 200mΩ; RoHS: Yes; ComponentLink1Description: Datasheet; ComponentLink1URL: https://wmsc.lcsc.com/wmsc/upload/file/pdf/v2/lcsc/2310301641_Sunlord-SDCL1005C3N9STDF_C14033.pdf; ComponentLink2Description: JLCPCB Part URL; ComponentLink2URL: https://jlcpcb.com/partdetail/C14033; ComponentLink3Description: LCSC Part URL; ComponentLink3URL: https://lcsc.com/product-detail/Inductors-SMD_Sunlord-Sunlord-SDCL1005C3N9STDF_C14033.html
footprint IND-0402 (0402 (1005M) Inductor)
pins: 1, 2

## SDCL1005C3N9STDFM01
designator L?  Inductance: 3.9nH
Inductor, 3.9nH, 200mΩ, 300mA, SMD 0402; Manufacturer: Sunlord; Manufacturer Part Number: SDCL1005C3N9STDFM01; Package Size: 0402; JLCPCB Basic Part: No; JLCPCB Part Number: C279863; Supplier 1: LCSC; Category: Inductors; Supplier Part Number 1: C279863; Rated Current: 300mA; DC Resistance: 200mΩ; RoHS: Yes; ComponentLink1Description: Datasheet; ComponentLink1URL: https://wmsc.lcsc.com/wmsc/upload/file/pdf/v2/lcsc/2110081330_Sunlord-SDCL1005C3N9STDFM01_C279863.pdf; ComponentLink2Description: JLCPCB Part URL; ComponentLink2URL: https://jlcpcb.com/partdetail/C279863; ComponentLink3Description: LCSC Part URL; ComponentLink3URL: https://lcsc.com/product-detail/Inductors-SMD_Sunlord-Sunlord-SDCL1005C3N9STDFM01_C279863.html
footprint IND-0402 (0402 (1005M) Inductor)
pins: 1, 2

## SDCL1005C3N9STDFM02
designator L?  Inductance: 3.9nH
Inductor, 3.9nH, SMD 0402; Manufacturer: Sunlord; Manufacturer Part Number: SDCL1005C3N9STDFM02; Package Size: 0402; JLCPCB Basic Part: No; JLCPCB Part Number: C370223; Supplier 1: LCSC; Category: Inductors; Supplier Part Number 1: C370223; RoHS: Yes; ComponentLink1Description: Datasheet; ComponentLink1URL: https://wmsc.lcsc.com/wmsc/upload/file/pdf/v2/lcsc/2110081530_Sunlord-SDCL1005C3N9STDFM02_C370223.pdf; ComponentLink2Description: JLCPCB Part URL; ComponentLink2URL: https://jlcpcb.com/partdetail/C370223; ComponentLink3Description: LCSC Part URL; ComponentLink3URL: https://lcsc.com/product-detail/Inductors-SMD_Sunlord-Sunlord-SDCL1005C3N9STDFM02_C370223.html
footprint IND-0402 (0402 (1005M) Inductor)
pins: 1, 2

## SDCL1005C4N3BTDF
designator L?  Inductance: 4.3nH
Inductor, 4.3nH, 200mΩ, 300mA, SMD 0402; Manufacturer: Sunlord; Manufacturer Part Number: SDCL1005C4N3BTDF; Package Size: 0402; JLCPCB Basic Part: No; JLCPCB Part Number: C370224; Supplier 1: LCSC; Category: Inductors; Supplier Part Number 1: C370224; Rated Current: 300mA; DC Resistance: 200mΩ; RoHS: Yes; ComponentLink1Description: Datasheet; ComponentLink1URL: https://wmsc.lcsc.com/wmsc/upload/file/pdf/v2/lcsc/2310301641_Sunlord-SDCL1005C4N3BTDF_C370224.pdf; ComponentLink2Description: JLCPCB Part URL; ComponentLink2URL: https://jlcpcb.com/partdetail/C370224; ComponentLink3Description: LCSC Part URL; ComponentLink3URL: https://lcsc.com/product-detail/Inductors-SMD_Sunlord-Sunlord-SDCL1005C4N3BTDF_C370224.html
footprint IND-0402 (0402 (1005M) Inductor)
pins: 1, 2

## SDCL1005C4N3CTDFM01
designator L?  Inductance: 4.3nH
Inductor, 4.3nH, SMD 0402; Manufacturer: Sunlord; Manufacturer Part Number: SDCL1005C4N3CTDFM01; Package Size: 0402; JLCPCB Basic Part: No; JLCPCB Part Number: C2991759; Supplier 1: LCSC; Category: Inductors; Supplier Part Number 1: C2991759; RoHS: Yes; ComponentLink1Description: Datasheet; ComponentLink1URL: https://wmsc.lcsc.com/wmsc/upload/file/pdf/v2/lcsc/2204082230_Sunlord-SDCL1005C4N3CTDFM01_C2991759.pdf; ComponentLink2Description: JLCPCB Part URL; ComponentLink2URL: https://jlcpcb.com/partdetail/C2991759; ComponentLink3Description: LCSC Part URL; ComponentLink3URL: https://lcsc.com/product-detail/Inductors-SMD_Sunlord-Sunlord-SDCL1005C4N3CTDFM01_C2991759.html
footprint IND-0402 (0402 (1005M) Inductor)
pins: 1, 2

## SDCL1005C4N3STDF
designator L?  Inductance: 4.3nH
Inductor, 4.3nH, 200mΩ, 300mA, SMD 0402; Manufacturer: Sunlord; Manufacturer Part Number: SDCL1005C4N3STDF; Self-Resonant Frequency: 100MHz; Q Factor: 8@100MHz; Package Size: 0402; JLCPCB Basic Part: No; JLCPCB Part Number: C52051; Supplier 1: LCSC; Category: Inductors; Supplier Part Number 1: C52051; Rated Current: 300mA; DC Resistance: 200mΩ; RoHS: Yes; ComponentLink1Description: Datasheet; ComponentLink1URL: https://wmsc.lcsc.com/wmsc/upload/file/pdf/v2/lcsc/2310301641_Sunlord-SDCL1005C4N3STDF_C52051.pdf; ComponentLink2Description: JLCPCB Part URL; ComponentLink2URL: https://jlcpcb.com/partdetail/C52051; ComponentLink3Description: LCSC Part URL; ComponentLink3URL: https://lcsc.com/product-detail/Inductors-SMD_Sunlord-Sunlord-SDCL1005C4N3STDF_C52051.html
footprint IND-0402 (0402 (1005M) Inductor)
pins: 1, 2

## SDCL1005C4N3STDFM01
designator L?  Inductance: 4.3nH
Inductor, 4.3nH, 200mΩ, 300mA, SMD 0402; Manufacturer: Sunlord; Manufacturer Part Number: SDCL1005C4N3STDFM01; Package Size: 0402; JLCPCB Basic Part: No; JLCPCB Part Number: C408633; Supplier 1: LCSC; Category: Inductors; Supplier Part Number 1: C408633; Rated Current: 300mA; DC Resistance: 200mΩ; RoHS: Yes; ComponentLink1Description: Datasheet; ComponentLink1URL: https://wmsc.lcsc.com/wmsc/upload/file/pdf/v2/lcsc/2110081530_Sunlord-SDCL1005C4N3STDFM01_C408633.pdf; ComponentLink2Description: JLCPCB Part URL; ComponentLink2URL: https://jlcpcb.com/partdetail/C408633; ComponentLink3Description: LCSC Part URL; ComponentLink3URL: https://lcsc.com/product-detail/Inductors-SMD_Sunlord-Sunlord-SDCL1005C4N3STDFM01_C408633.html
footprint IND-0402 (0402 (1005M) Inductor)
pins: 1, 2

## SDCL1005C4N7STDF
designator L?  Inductance: 4.7nH
Inductor, 4.7nH, 200mΩ, 300mA, SMD 0402; Manufacturer: Sunlord; Manufacturer Part Number: SDCL1005C4N7STDF; Self-Resonant Frequency: 100MHz; Q Factor: 8@100MHz; Package Size: 0402; JLCPCB Basic Part: No; JLCPCB Part Number: C13595; Supplier 1: LCSC; Category: Inductors; Supplier Part Number 1: C13595; Rated Current: 300mA; DC Resistance: 200mΩ; RoHS: Yes; ComponentLink1Description: Datasheet; ComponentLink1URL: https://wmsc.lcsc.com/wmsc/upload/file/pdf/v2/lcsc/2310301641_Sunlord-SDCL1005C4N7STDF_C13595.pdf; ComponentLink2Description: JLCPCB Part URL; ComponentLink2URL: https://jlcpcb.com/partdetail/C13595; ComponentLink3Description: LCSC Part URL; ComponentLink3URL: https://lcsc.com/product-detail/Inductors-SMD_Sunlord-Sunlord-SDCL1005C4N7STDF_C13595.html
footprint IND-0402 (0402 (1005M) Inductor)
pins: 1, 2

## SDCL1005C4N7STDFM01
designator L?  Inductance: 4.7nH
Inductor, 4.7nH, 200mΩ, 300mA, SMD 0402; Manufacturer: Sunlord; Manufacturer Part Number: SDCL1005C4N7STDFM01; Package Size: 0402; JLCPCB Basic Part: No; JLCPCB Part Number: C370226; Supplier 1: LCSC; Category: Inductors; Supplier Part Number 1: C370226; Rated Current: 300mA; DC Resistance: 200mΩ; RoHS: Yes; ComponentLink1Description: Datasheet; ComponentLink1URL: https://wmsc.lcsc.com/wmsc/upload/file/pdf/v2/lcsc/2110081530_Sunlord-SDCL1005C4N7STDFM01_C370226.pdf; ComponentLink2Description: JLCPCB Part URL; ComponentLink2URL: https://jlcpcb.com/partdetail/C370226; ComponentLink3Description: LCSC Part URL; ComponentLink3URL: https://lcsc.com/product-detail/Inductors-SMD_Sunlord-Sunlord-SDCL1005C4N7STDFM01_C370226.html
footprint IND-0402 (0402 (1005M) Inductor)
pins: 1, 2
